# Altium footprint library General.PcbLib: 246 footprints (part 3 of 16)
Each footprint in its own frame and in the unit in brackets; x right, y up, seen from the top. Pads: shape width x height; smd on the part's side, far side on the other; paste and mask are expansions set on the pad; w line width, h text height; cw(c..) or ccw(c..) is an arc to the next point about the centre after c.
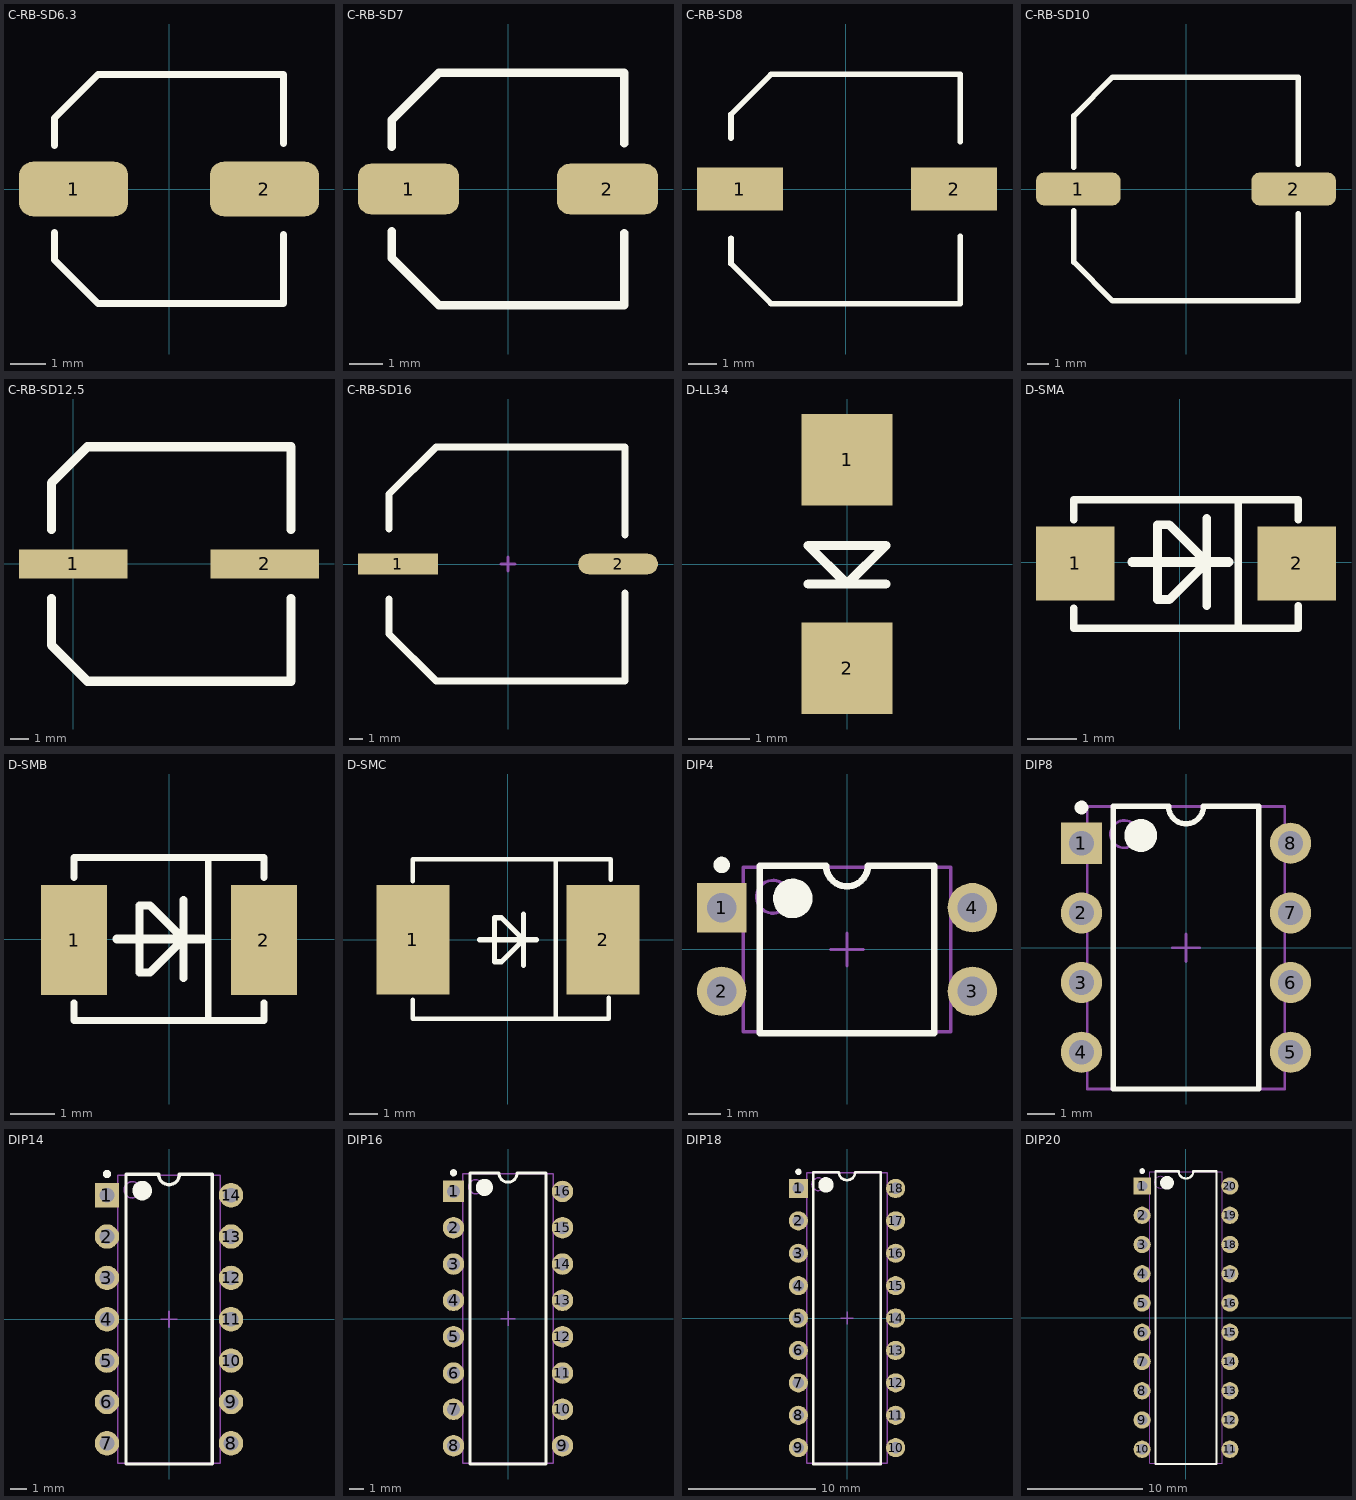
[diagram p2: the footprints below, top view; thin cyan lines are the x and y axes]

## C-RB-SD6.3 [mil] "贴片铝电解"
height 275.59
pads (2):
  rrect50% 120x60 smd: 1(-105,0) 2(105,0)
Top Overlay:
  lines w7.87: -125.98,-48 -125.98,-78.02 -78.02,-125.98 125.98,-125.98 125.98,-50 ; -125.98,48 -125.98,78.02 -78.02,125.98 125.98,125.98 125.98,50
3D body "SL-E.STEP": height 204.72, standoff 0, extent -137.79,-129.92 137.8,129.92

## C-RB-SD7 [mil]
pads (2):
  rrect50% 120x60 smd: 1(-118.11,0) 2(118.11,0)
Top Overlay:
  lines w10: -137.8,-50 -137.8,-82.2 -82.2,-137.8 137.8,-137.8 137.8,-52.2 ; -137.8,50.2 -137.8,82.2 -82.2,137.8 137.8,137.8 137.8,54
3D body "User Library-ALU-D.STEP": height 212.6, standoff 0, extent -137.8,-129.92 137.79,129.92

## C-RB-SD8 [mm] "贴片铝电解"
height 10.2
pads (2):
  rect 3x1.5 smd: 1(-3.683,0) 2(3.785,0)
Top Overlay:
  lines w0.2: -4,-1.714 -4,-2.604 -2.604,-4 4,-4 4,-1.651 ; -4,1.778 -4,2.604 -2.604,4 4,4 4,1.651
3D body "User Library-ALU-E.STEP": height 6.2, standoff 0, extent -4.5,-4.15 4.5,4.15

## C-RB-SD10 [mil] "贴片铝电解"
height 401.57
pads (2):
  rrect50% 155x60 smd: 1(-196.85,0) 2(196.85,0)
Top Overlay:
  lines w10: -205,-40 -205,-133.72 -134,-204.72 204.28,-204.72 205,-204 205,-45 ; -205,40 -205,134 ; -204.35,134.37 -134,204.72 204.28,204.72 205,204 205,45
3D body "SW3dPS-capacitor size G.STEP": height 401.77, standoff -0.2, extent -227.34,-201.51 229.35,204

## C-RB-SD12.5 [mm]
pads (2):
  rect 6x1.6 smd: 1(0,0) 2(10.625,0)
Top Overlay:
  lines w0.508: -1.202,-1.905 -1.202,-4.498 0.799,-6.499 12.065,-6.499 12.065,-1.905 ; -1.202,1.905 -1.202,4.494 0.797,6.493 0.799,6.495 12.065,6.495 12.065,1.905

## C-RB-SD16 [mm]
pads (2):
  rect 5.8x1.5 smd: 1(-8.001,0)
  oval 5.8x1.5 smd: 2(8.001,0)
Top Overlay:
  lines w0.508: -8.636,-2.54 -8.636,-5.08 -5.216,-8.5 8.5,-8.5 8.5,-4.25 8.5,-2.125 ; -8.636,2.54 -8.636,5.08 -5.216,8.5 8.5,8.5 8.5,4.25 8.5,2.125
Mechanical 15:
  lines w0.2: -0.508,0 0.508,0 ; 0,-0.508 0,0.508
3D body "CM H(16X16.5).STEP": height 16.5, standoff -0.01, extent -9.4,-8.5 9.4,8.5

## D-LL34 [mm]
pads (2):
  rect 1.5x1.5 smd: 1(0,1.714) 2(0,-1.714)
Top Overlay:
  lines w0.152: -0.635,-0.33 0.635,-0.33 ; -0.635,0.305 0,-0.33 0.635,0.305 -0.635,0.305
3D body "User Library-smd diode 1206.STEP": height 1.43, standoff -0.02, extent -0.725,-1.75 0.725,1.75

## D-SMA [mm]
height 2
pads (2):
  rect 1.6x1.5 smd: 1(-2.123,-0.025) 2(2.377,-0.025)
Top Overlay:
  lines w0.152: -2.159,-0.94 -2.159,-1.346 2.413,-1.346 2.413,-0.889 ; -2.159,0.864 -2.159,1.27 2.413,1.27 2.413,0.864 ; 1.194,-1.346 1.194,1.27
  lines w0.178: 0.548,-0.889 0.548,0.889 ; -0.452,-0.762 -0.214,-0.762 0.548,0 -0.214,0.762 -0.452,0.762 -0.452,-0.762
  lines w0.2: -0.965,0 0.991,0
3D body "SW3dPS-DO-214AC SMA.STEP": height 2.42, standoff 0.02, extent -2.54,-1.33 2.66,1.27

## D-SMB [mm] "DO-214-AA/SMB;"
height 2.54
pads (2):
  rect 1.5x2.5 smd: 1(-2.159,-0.025) 2(2.159,-0.025)
Top Overlay:
  lines w0.152: -2.159,-1.448 -2.159,-1.854 2.159,-1.854 2.159,-1.448 ; -2.159,1.397 -2.159,1.854 2.159,1.854 2.159,1.397 ; 0.889,-1.854 0.889,1.854
  lines w0.178: 0.33,-0.889 0.33,0.889 ; -0.67,-0.762 -0.67,0.762 -0.432,0.762 0.33,0 -0.432,-0.762 -0.67,-0.762
  lines w0.2: -1.183,0 0.773,0
3D body "User Library-DO-214AA_SMB.STEP": height 2.2, standoff -0.05, extent -2.637,-1.85 2.663,1.85

## D-SMC [mm] "贴片二极管"
height 1.5
pads (2):
  rect 2.54x3.81 smd: 1(-3.287,0) 2(3.313,0)
Top Overlay:
  lines w0.152: -3.289,-2.083 -3.289,-2.743 3.505,-2.743 3.505,-2.007 ; -3.289,2.032 -3.289,2.794 3.581,2.794 3.581,2.083 ; 1.664,-2.743 1.664,2.769
  lines w0.178: 0.548,-0.889 0.548,0.889 ; -0.452,-0.762 -0.214,-0.762 0.548,0 -0.214,0.762 -0.452,0.762 -0.452,-0.762
  lines w0.2: -0.965,0 0.991,0
3D body "DO-214AB.STEP": height 2.7, standoff 0, extent -4.06,-3.1 4.06,3.1

## DIP4 [mm] "DIP; 4 Leads; Row Spacing 7.62 mm; Pitch 2.54 mm"
height 5.6
pads (4):
  rect 1.5x1.5 hole 0.9: 1(-3.81,1.27)
  round 1.5 hole 0.9: 2(-3.81,-1.27) 3(3.81,-1.27) 4(3.81,1.27)
Top Overlay:
  circle w0.6: c-1.65,1.55 r0.3
  circle w0.25: c-3.81,2.57 r0.125
  lines w0.2: -2.65,-2.55 2.65,-2.55 2.65,2.55 0.635,2.55 cw(c0,2.55) -0.635,2.55 -2.65,2.55 -2.65,-2.55
Mechanical 13:
  circle w0.1: c-2.25,1.6 r0.5
  lines w0.1: -3.15,-2.5 3.15,-2.5 3.15,2.5 -3.15,2.5 -3.15,-2.5
Mechanical 15:
  lines w0.1: -0.5,0 0.5,0 ; 0,-0.5 0,0.5
3D body "SW3DPS-DIP4-DEFAULT.STEP": height 4.31, standoff -3.28, extent -4.076,-2.797 3.924,2.743

## DIP8 [mm] "DIP; 8 Leads; Row Spacing 7.62 mm; Pitch 2.54 mm"
height 5.08
pads (8):
  rect 1.5x1.5 hole 0.9: 1(-3.81,3.81)
  round 1.5 hole 0.9: 2(-3.81,1.27) 3(-3.81,-1.27) 4(-3.81,-3.81) 5(3.81,-3.81) 6(3.81,-1.27) 7(3.81,1.27) 8(3.81,3.81)
Top Overlay:
  circle w0.6: c-1.65,4.09 r0.3
  circle w0.25: c-3.81,5.11 r0.125
  lines w0.2: -2.65,-5.15 2.65,-5.15 2.65,5.15 0.635,5.15 cw(c0,5.15) -0.635,5.15 -2.65,5.15 -2.65,-5.15
Mechanical 13:
  circle w0.1: c-2.25,4.14 r0.5
  lines w0.1: -3.6,-5.15 3.6,-5.15 3.6,5.15 -3.6,5.15 -3.6,-5.15
Mechanical 15:
  lines w0.1: -0.5,0 0.5,0 ; 0,-0.5 0,0.5
3D body "DIP.STEP": height 5.33, standoff -2.41, extent -3.937,-5.08 3.937,5.08

## DIP14 [mm] "DIP; 14 Leads; Row Spacing 7.62 mm; Pitch 2.54 mm"
height 5.08
pads (14):
  rect 1.5x1.5 hole 0.9: 1(-3.81,7.62)
  round 1.5 hole 0.9: 2(-3.81,5.08) 3(-3.81,2.54) 4(-3.81,0) 5(-3.81,-2.54) 6(-3.81,-5.08) 7(-3.81,-7.62) 8(3.81,-7.62) 9(3.81,-5.08) 10(3.81,-2.54) 11(3.81,0) 12(3.81,2.54) 13(3.81,5.08) 14(3.81,7.62)
Top Overlay:
  circle w0.25: c-3.81,8.92 r0.125
  circle w0.6: c-1.65,7.9 r0.3
  lines w0.2: -2.642,-8.89 -2.642,8.9 -0.635,8.9 ccw(c0,8.9) 0.635,8.9 2.65,8.9 2.65,-8.89 -2.642,-8.89
Mechanical 13:
  circle w0.1: c-2.25,7.95 r0.5
  lines w0.1: -3.15,-8.85 -3.15,8.85 3.15,8.85 3.15,-8.85 -3.15,-8.85
Mechanical 15:
  lines w0.1: -0.5,0 0.5,0 ; 0,-0.5 0,0.5
3D body "DIP14.STEP": height 3.8, standoff -4.02, extent -3.921,-8.516 3.929,8.504

## DIP16 [mm] "DIP; 16 Leads; Row Spacing 7.62 mm; Pitch 2.54 mm"
height 5.08
pads (16):
  rect 1.5x1.5 hole 0.9: 1(-3.81,8.89)
  round 1.5 hole 0.9: 2(-3.81,6.35) 3(-3.81,3.81) 4(-3.81,1.27) 5(-3.81,-1.27) 6(-3.81,-3.81) 7(-3.81,-6.35) 8(-3.81,-8.89) 9(3.81,-8.89) 10(3.81,-6.35) 11(3.81,-3.81) 12(3.81,-1.27) 13(3.81,1.27) 14(3.81,3.81) 15(3.81,6.35) 16(3.81,8.89)
Top Overlay:
  circle w0.6: c-1.65,9.17 r0.3
  circle w0.25: c-3.81,10.19 r0.125
  lines w0.2: -2.667,-10.17 -2.667,10.17 -0.635,10.17 ccw(c0,10.17) 0.635,10.17 2.667,10.17 2.667,-10.17 -2.667,-10.17
Mechanical 13:
  circle w0.1: c-2.25,9.22 r0.5
  lines w0.1: -3.15,-10.109 -3.15,10.12 3.15,10.12 3.15,-10.109 -3.15,-10.109
Mechanical 15:
  lines w0.1: -0.5,0 0.5,0 ; 0,-0.5 0,0.5
3D body "DIP16.STEP": height 3.8, standoff -4.02, extent -3.925,-9.78 3.925,9.78

## DIP18 [mm] "DIP; 18 Leads; Row Spacing 7.62 mm; Pitch 2.54 mm"
height 5.08
pads (18):
  rect 1.5x1.5 hole 0.9: 1(-3.81,10.16)
  round 1.5 hole 0.9: 2(-3.81,7.62) 3(-3.81,5.08) 4(-3.81,2.54) 5(-3.81,0) 6(-3.81,-2.54) 7(-3.81,-5.08) 8(-3.81,-7.62) 9(-3.81,-10.16) 10(3.81,-10.16) 11(3.81,-7.62) 12(3.81,-5.08) 13(3.81,-2.54) 14(3.81,0) 15(3.81,2.54) 16(3.81,5.08) 17(3.81,7.62) 18(3.81,10.16)
Top Overlay:
  circle w0.25: c-3.81,11.46 r0.125
  circle w0.6: c-1.65,10.44 r0.3
  lines w0.2: -2.65,-11.44 -2.65,11.44 -0.635,11.44 ccw(c0,11.44) 0.635,11.44 2.65,11.44 2.65,-11.44 -2.65,-11.44
Mechanical 13:
  circle w0.1: c-2.25,10.49 r0.5
  lines w0.1: -3.15,-11.39 -3.15,11.39 3.15,11.39 3.15,-11.39 -3.15,-11.39
Mechanical 15:
  lines w0.1: -0.5,0 0.5,0 ; 0,-0.5 0,0.5
3D body "User Library-DIP18-300.step": height 5.08, standoff -2.49, extent -3.935,-11.495 3.935,11.495

## DIP20 [mm] "DIP; 20 Leads; Row Spacing 7.62 mm; Pitch 2.54 mm"
height 5.08
pads (20):
  rect 1.5x1.5 hole 0.9: 1(-3.81,11.43)
  round 1.5 hole 0.9: 2(-3.81,8.89) 3(-3.81,6.35) 4(-3.81,3.81) 5(-3.81,1.27) 6(-3.81,-1.27) 7(-3.81,-3.81) 8(-3.81,-6.35) 9(-3.81,-8.89) 10(-3.81,-11.43) 11(3.81,-11.43) 12(3.81,-8.89) 13(3.81,-6.35) 14(3.81,-3.81) 15(3.81,-1.27) 16(3.81,1.27) 17(3.81,3.81) 18(3.81,6.35) 19(3.81,8.89) 20(3.81,11.43)
Top Overlay:
  circle w0.6: c-1.65,11.71 r0.3
  circle w0.25: c-3.81,12.73 r0.125
  circle w0.25: c-3.81,11.46 r0.125
  lines w0.2: -2.65,-12.71 2.65,-12.71 2.65,12.71 0.635,12.71 cw(c0,12.71) -0.635,12.71 -2.65,12.71 -2.65,-12.71
Mechanical 13:
  circle w0.1: c-2.25,11.76 r0.5
  lines w0.1: -3.15,-12.66 3.15,-12.66 3.15,7.66 3.15,12.66 -3.15,12.66 -3.15,7.66 -3.15,-12.634
3D body "User Library-DIP20-300-metric.step": height 4.5, standoff -3.5, extent -3.88,-12.8 3.88,12.8